# Altium footprint library TarabusLibrary.PcbLib: 591 footprints (part 30 of 37)
Each footprint in its own frame and in the unit in brackets; x right, y up, seen from the top. Pads: shape width x height; smd on the part's side, far side on the other; paste and mask are expansions set on the pad; w line width, h text height; cw(c..) or ccw(c..) is an arc to the next point about the centre after c.
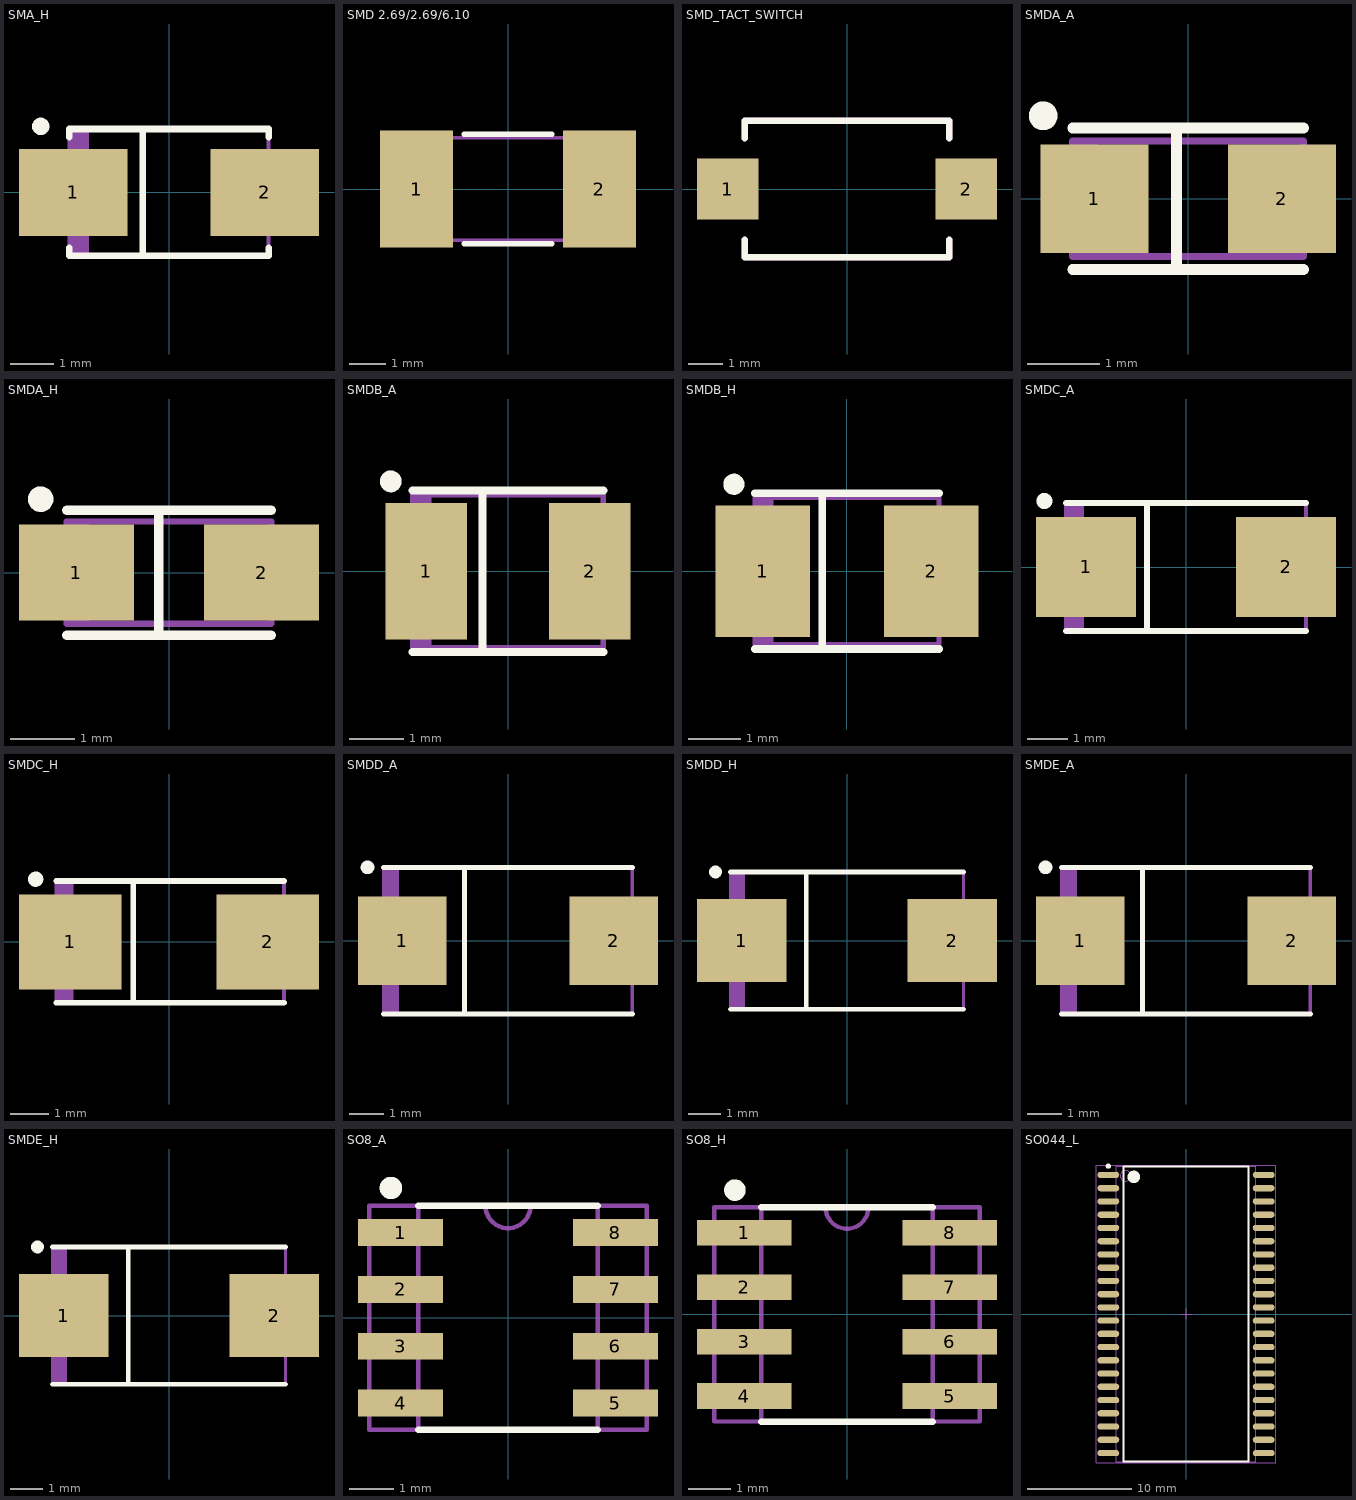
[diagram p29: the footprints below, top view; thin cyan lines are the x and y axes]

## SMA_H [mm]
height 2.67
pads (2):
  rect 2.5x2 smd: 1(-2.2,0) 2(2.2,0)
Top Overlay:
  circle w0.2: c-2.95,1.52 r0.1
  lines w0.15: -2.29,-1.27 -2.29,-1.46 2.29,-1.46 2.29,-1.27 ; -2.29,1.27 -2.29,1.46 2.29,1.46 2.29,1.27 ; -0.6,-1.45 -0.6,1.45
Mechanical 7:
  lines w0.1: -2.29,-0.82 -2.8,-0.82 -2.8,0.82 -2.29,0.82 ; -2.19,-1.44 -2.19,1.46 ; -2.09,-1.44 -2.09,1.46 ; -1.99,-1.44 -1.99,1.46 ; -1.89,-1.44 -1.89,1.46 ; 2.29,-0.82 2.8,-0.82 2.8,0.82 2.29,0.82 ; -2.29,-1.46 -2.29,1.46 2.29,1.46 2.29,-1.46 -2.29,-1.46
Mechanical 10:
  text ".Comment" at -0.88,-2.11 h0.6
  text ".Designator" at -1.12,1.81 h0.8
3D body: height 2, standoff 0, extent 2.29,-0.82 2.8,0.82
3D body: height 2, standoff 0, extent -2.8,-0.82 -2.29,0.82
3D body: height 2.87, standoff 0, extent -2.29,-1.46 2.29,1.46

## SMD 2.69/2.69/6.10 [mm]
pads (2):
  rect 2x3.2 smd: 1(-2.5,0) 2(2.5,0)
Top Overlay:
  lines w0.15: -1.2,-1.5 1.2,-1.5 ; -1.2,1.5 1.2,1.5
Mechanical 7:
  lines w0.1: -3.1,-1.4 -3.1,1.4 3.1,1.4 3.1,-1.4 -3.1,-1.4
3D body: height 2.69, standoff 0, extent -3.1,-1.4 3.1,1.4

## SMD_TACT_SWITCH [mm]
height 2.5
pads (2):
  rect 1.8x1.8 smd: 1(-3.5,0) 2(3.5,0)
Top Overlay:
  lines w0.2: -3,-1.5 -3,-2 3,-2 3,-1.5 ; -3,1.5 -3,2 3,2 3,1.5
Mechanical 7:
  lines w0.2: -3,-1.5 -3,-2 3,-2 3,-1.5 ; -3,1.5 -3,2 3,2 3,1.5
Mechanical 10:
  text ".Designator" at -0.5,2.5 h0.8
  text ".Comment" at 0.5,-3 h0.6
3D body "Кнопка_IT-1181.STEP": height 2.5, standoff 0, extent -4,-1.8 4,1.8

## SMDA_A [mm]
height 1.6
pads (2):
  rect 1.5x1.5 smd: 1(-1.3,0) 2(1.3,0)
Top Overlay:
  circle w0.2: c-2.01,1.15 r0.1
  lines w0.15: -1.6,-0.98 1.6,-0.98 ; -1.6,0.98 1.6,0.98 ; -0.16,-0.98 -0.16,0.98
Mechanical 7:
  lines w0.1: -1.5,-0.8 -1.5,0.8 ; -1.4,-0.8 -1.4,0.8 ; -1.3,-0.8 -1.3,0.8 ; -1.6,-0.8 1.6,-0.8 1.6,0.8 -1.6,0.8 -1.6,-0.8
Mechanical 10:
  text ".Comment" at -0.88,-1.58 h0.6
  text ".Designator" at -0.84,1.25 h0.8
3D body: height 1.6, standoff 0, extent -1.6,-0.8 1.6,0.8

## SMDA_H [mm]
height 1.6
pads (2):
  rect 1.8x1.5 smd: 1(-1.45,0) 2(1.45,0)
Top Overlay:
  circle w0.2: c-2.01,1.15 r0.1
  lines w0.15: -1.6,-0.98 1.6,-0.98 ; -1.6,0.98 1.6,0.98 ; -0.16,-0.98 -0.16,0.98
Mechanical 7:
  lines w0.1: -1.5,-0.8 -1.5,0.8 ; -1.4,-0.8 -1.4,0.8 ; -1.3,-0.8 -1.3,0.8 ; -1.6,-0.8 -1.6,0.8 1.6,0.8 1.6,-0.8 -1.6,-0.8
Mechanical 10:
  text ".Designator" at -0.84,1.25 h0.8
  text ".Comment" at -0.92,-1.56 h0.6
3D body: height 1.6, standoff 0, extent -1.6,-0.8 1.6,0.8

## SMDB_A [mm]
height 1.9
pads (2):
  rect 1.5x2.5 smd: 1(-1.5,0) 2(1.5,0)
Top Overlay:
  circle w0.2: c-2.15,1.65 r0.1
  lines w0.15: -1.75,-1.48 1.75,-1.48 ; -1.75,1.48 1.75,1.48 ; -0.47,-1.48 -0.47,1.48
Mechanical 7:
  lines w0.1: -1.65,-1.4 -1.65,1.4 ; -1.55,-1.4 -1.55,1.4 ; -1.45,-1.4 -1.45,1.4 ; -1.75,-1.4 -1.75,1.4 1.75,1.4 1.75,-1.4 -1.75,-1.4
Mechanical 10:
  text ".Designator" at -0.9,1.7 h0.8
  text ".Comment" at -1.02,-2.08 h0.6
3D body: height 1.9, standoff 0, extent -1.75,-1.4 1.75,1.4

## SMDB_H [mm]
height 1.9
pads (2):
  rect 1.8x2.5 smd: 1(-1.6,0) 2(1.6,0)
Top Overlay:
  circle w0.2: c-2.15,1.65 r0.1
  lines w0.15: -1.75,-1.48 1.75,-1.48 ; -1.75,1.48 1.75,1.48 ; -0.47,-1.48 -0.47,1.48
Mechanical 7:
  lines w0.1: -1.65,-1.4 -1.65,1.4 ; -1.55,-1.4 -1.55,1.4 ; -1.45,-1.4 -1.45,1.4 ; -1.75,-1.4 1.75,-1.4 1.75,1.4 -1.75,1.4 -1.75,-1.4
Mechanical 10:
  text ".Comment" at -1.08,-2.08 h0.6
  text ".Designator" at -0.9,1.7 h0.8
3D body: height 1.9, standoff 0, extent -1.75,-1.4 1.75,1.4

## SMDC_A [mm]
height 2.5
pads (2):
  rect 2.5x2.5 smd: 1(-2.5,0) 2(2.5,0)
Top Overlay:
  circle w0.2: c-3.54,1.65 r0.1
  lines w0.15: -3,-1.6 3,-1.6 ; -3,1.6 3,1.6 ; -0.97,-1.6 -0.97,1.6
Mechanical 7:
  lines w0.1: -2.9,-1.6 -2.9,1.6 ; -2.8,-1.6 -2.8,1.6 ; -2.7,-1.6 -2.7,1.6 ; -2.6,-1.6 -2.6,1.6 ; -3,-1.6 3,-1.6 3,1.6 -3,1.6 -3,-1.6
Mechanical 10:
  text ".Designator" at -0.6,1.87 h0.8
  text ".Comment" at -0.47,-2.28 h0.6
3D body: height 2.5, standoff 0, extent -3,-1.6 3,1.6

## SMDC_H [mm]
height 2.5
pads (2):
  rect 2.7x2.5 smd: 1(-2.6,0) 2(2.6,0)
Top Overlay:
  circle w0.2: c-3.51,1.65 r0.1
  lines w0.15: -2.97,-1.6 3.03,-1.6 ; -2.97,1.6 3.03,1.6 ; -0.94,-1.6 -0.94,1.6
Mechanical 7:
  lines w0.1: -2.87,-1.6 -2.87,1.6 ; -2.77,-1.6 -2.77,1.6 ; -2.67,-1.6 -2.67,1.6 ; -2.57,-1.6 -2.57,1.6 ; -2.97,-1.6 3.03,-1.6 3.03,1.6 -2.97,1.6 -2.97,-1.6
Mechanical 10:
  text ".Designator" at -0.6,1.89 h0.8
  text ".Comment" at -0.7,-2.3 h0.6
3D body: height 2.5, standoff 0, extent -2.97,-1.6 3.03,1.6

## SMDD_A [mm]
height 2.8
pads (2):
  rect 2.6x2.6 smd: 1(-3.1,0) 2(3.1,0)
Top Overlay:
  circle w0.2: c-4.12,2.15 r0.1
  lines w0.15: -3.65,-2.15 3.65,-2.15 ; -3.65,2.15 3.65,2.15 ; -1.28,-2.15 -1.28,2.15
Mechanical 7:
  lines w0.1: -3.55,-2.15 -3.55,2.15 ; -3.45,-2.15 -3.45,2.15 ; -3.35,-2.15 -3.35,2.15 ; -3.25,-2.15 -3.25,2.15 ; -3.65,-2.15 -3.65,2.15 3.65,2.15 3.65,-2.15 -3.65,-2.15
Mechanical 10:
  text ".Comment" at -0.9,-2.91 h0.6
  text ".Designator" at -0.84,2.54 h0.8
3D body: height 2.8, standoff 0, extent -3.65,-2.15 3.65,2.15

## SMDD_H [mm]
height 2.8
pads (2):
  rect 2.8x2.6 smd: 1(-3.3,0) 2(3.3,0)
Top Overlay:
  circle w0.2: c-4.12,2.15 r0.1
  lines w0.15: -3.65,-2.15 3.65,-2.15 ; -3.65,2.15 3.65,2.15 ; -1.28,-2.15 -1.28,2.15
Mechanical 7:
  lines w0.1: -3.55,-2.15 -3.55,2.15 ; -3.45,-2.15 -3.45,2.15 ; -3.35,-2.15 -3.35,2.15 ; -3.25,-2.15 -3.25,2.15 ; -3.65,-2.15 3.65,-2.15 3.65,2.15 -3.65,2.15 -3.65,-2.15
Mechanical 10:
  text ".Designator" at -0.84,2.54 h0.8
  text ".Comment" at -0.83,-2.85 h0.6
3D body: height 2.8, standoff 0, extent -3.65,-2.15 3.65,2.15

## SMDE_A [mm]
height 4
pads (2):
  rect 2.6x2.6 smd: 1(-3.1,0) 2(3.1,0)
Top Overlay:
  circle w0.2: c-4.12,2.15 r0.1
  lines w0.15: -3.65,-2.15 3.65,-2.15 ; -3.65,2.15 3.65,2.15 ; -1.28,-2.15 -1.28,2.15
Mechanical 7:
  lines w0.1: -3.55,-2.15 -3.55,2.15 ; -3.45,-2.15 -3.45,2.15 ; -3.35,-2.15 -3.35,2.15 ; -3.25,-2.15 -3.25,2.15 ; -3.65,-2.15 3.65,-2.15 3.65,2.15 -3.65,2.15 -3.65,-2.15
Mechanical 10:
  text ".Designator" at -0.84,2.54 h0.8
  text ".Comment" at -0.78,-2.82 h0.6
3D body: height 4, standoff 0, extent -3.65,-2.15 3.65,2.15

## SMDE_H [mm]
height 4
pads (2):
  rect 2.8x2.6 smd: 1(-3.3,0) 2(3.3,0)
Top Overlay:
  circle w0.2: c-4.12,2.15 r0.1
  lines w0.15: -3.65,-2.15 3.65,-2.15 ; -3.65,2.15 3.65,2.15 ; -1.28,-2.15 -1.28,2.15
Mechanical 7:
  lines w0.1: -3.55,-2.15 -3.55,2.15 ; -3.45,-2.15 -3.45,2.15 ; -3.35,-2.15 -3.35,2.15 ; -3.25,-2.15 -3.25,2.15 ; -3.65,-2.15 -3.65,2.15 3.65,2.15 3.65,-2.15 -3.65,-2.15
Mechanical 10:
  text ".Comment" at -0.82,-2.87 h0.6
  text ".Designator" at -0.84,2.54 h0.8
3D body: height 4, standoff 0, extent -3.65,-2.15 3.65,2.15

## SO8_A [mm]
height 1.75
pads (8):
  rect 1.9x0.6 smd: 1(-2.4,1.905) 2(-2.4,0.635) 3(-2.4,-0.635) 4(-2.4,-1.905) 5(2.4,-1.905) 6(2.4,-0.635) 7(2.4,0.635) 8(2.4,1.905)
Top Overlay:
  circle w0.25: c-2.615,2.9 r0.125
  lines w0.15: -2,-2.5 2,-2.5 ; -2,2.5 2,2.5
Mechanical 7:
  lines w0.1: -2,-2.5 -2,2.5 ; -0.5,2.5 ccw(c0,2.5) 0.5,2.5 ; 2,-2.5 2,2.5 ; -3.1,-2.5 -3.1,2.5 3.1,2.5 3.1,-2.5 -3.1,-2.5
Mechanical 10:
  text ".Designator" at -1,3.02 h0.8
  text ".Comment" at -0.69,-3.25 h0.6
3D body: height 1.75, standoff 0, extent -2,-2.5 2,2.5
3D body: height 1, standoff 0, extent -3.1,-2.5 -2,2.5
3D body: height 1, standoff 0, extent 2,-2.5 3.1,2.5

## SO8_H [mm]
height 1.75
pads (8):
  rect 2.2x0.6 smd: 1(-2.4,1.905) 2(-2.4,0.635) 3(-2.4,-0.635) 4(-2.4,-1.905) 5(2.4,-1.905) 6(2.4,-0.635) 7(2.4,0.635) 8(2.4,1.905)
Top Overlay:
  circle w0.25: c-2.615,2.9 r0.125
  lines w0.15: -2,-2.5 2,-2.5 ; -2,2.5 2,2.5
Mechanical 7:
  lines w0.1: -2,-2.5 -2,2.5 ; -0.5,2.5 ccw(c0,2.5) 0.5,2.5 ; 2,-2.5 2,2.5 ; -3.1,-2.5 -3.1,2.5 3.1,2.5 3.1,-2.5 -3.1,-2.5
Mechanical 10:
  text ".Designator" at -1,3.02 h0.8
  text ".Comment" at -0.69,-3.25 h0.6
3D body: height 1.75, standoff 0, extent -2,-2.5 2,2.5
3D body: height 1, standoff 0, extent -3.1,-2.5 -2,2.5
3D body: height 1, standoff 0, extent 2,-2.5 3.1,2.5

## SO044_L [mm] "44-Pin Small Outline Package 1.27 mm Pitch, IPC High Density"
pads (44):
  oval 2.1x0.6 smd: 1(-7.45,13.335) 2(-7.45,12.065) 3(-7.45,10.795) 4(-7.45,9.525) 5(-7.45,8.255) 6(-7.45,6.985) 7(-7.45,5.715) 8(-7.45,4.445) 9(-7.45,3.175) 10(-7.45,1.905) 11(-7.45,0.635) 12(-7.45,-0.635) 13(-7.45,-1.905) 14(-7.45,-3.175) 15(-7.45,-4.445) 16(-7.45,-5.715) 17(-7.45,-6.985) 18(-7.45,-8.255) 19(-7.45,-9.525) 20(-7.45,-10.795) 21(-7.45,-12.065) 22(-7.45,-13.335) 23(7.45,-13.335) 24(7.45,-12.065) 25(7.45,-10.795) 26(7.45,-9.525) 27(7.45,-8.255) 28(7.45,-6.985) 29(7.45,-5.715) 30(7.45,-4.445) 31(7.45,-3.175) 32(7.45,-1.905) 33(7.45,-0.635) 34(7.45,0.635) 35(7.45,1.905) 36(7.45,3.175) 37(7.45,4.445) 38(7.45,5.715) 39(7.45,6.985) 40(7.45,8.255) 41(7.45,9.525) 42(7.45,10.795) 43(7.45,12.065) 44(7.45,13.335)
Top Overlay:
  circle w0.25: c-7.45,14.185 r0.125
  circle w0.6: c-5,13.15 r0.3
  lines w0.2: -6,-14.15 -6,14.15 6,14.15 6,-14.15 -6,-14.15
Mechanical 13:
  circle w0.1: c-5.8,13.25 r0.5
  lines w0.1: -6.7,-14.15 -6.7,14.15 6.7,14.15 6.7,-14.15 -6.7,-14.15
Mechanical 15:
  lines w0.1: -0.5,0 0.5,0 ; 0,-0.5 0,0.5 ; -8.6,-14.25 -8.6,14.25 8.6,14.25 8.6,-14.25 -8.6,-14.25
3D body: height 0, standoff 0, extent -6.7,-14.15 6.7,14.15